# Altium footprint library laihi.PcbLib: 222 footprints (part 5 of 14)
Each footprint in its own frame and in the unit in brackets; x right, y up, seen from the top. Pads: shape width x height; smd on the part's side, far side on the other; paste and mask are expansions set on the pad; w line width, h text height; cw(c..) or ccw(c..) is an arc to the next point about the centre after c.
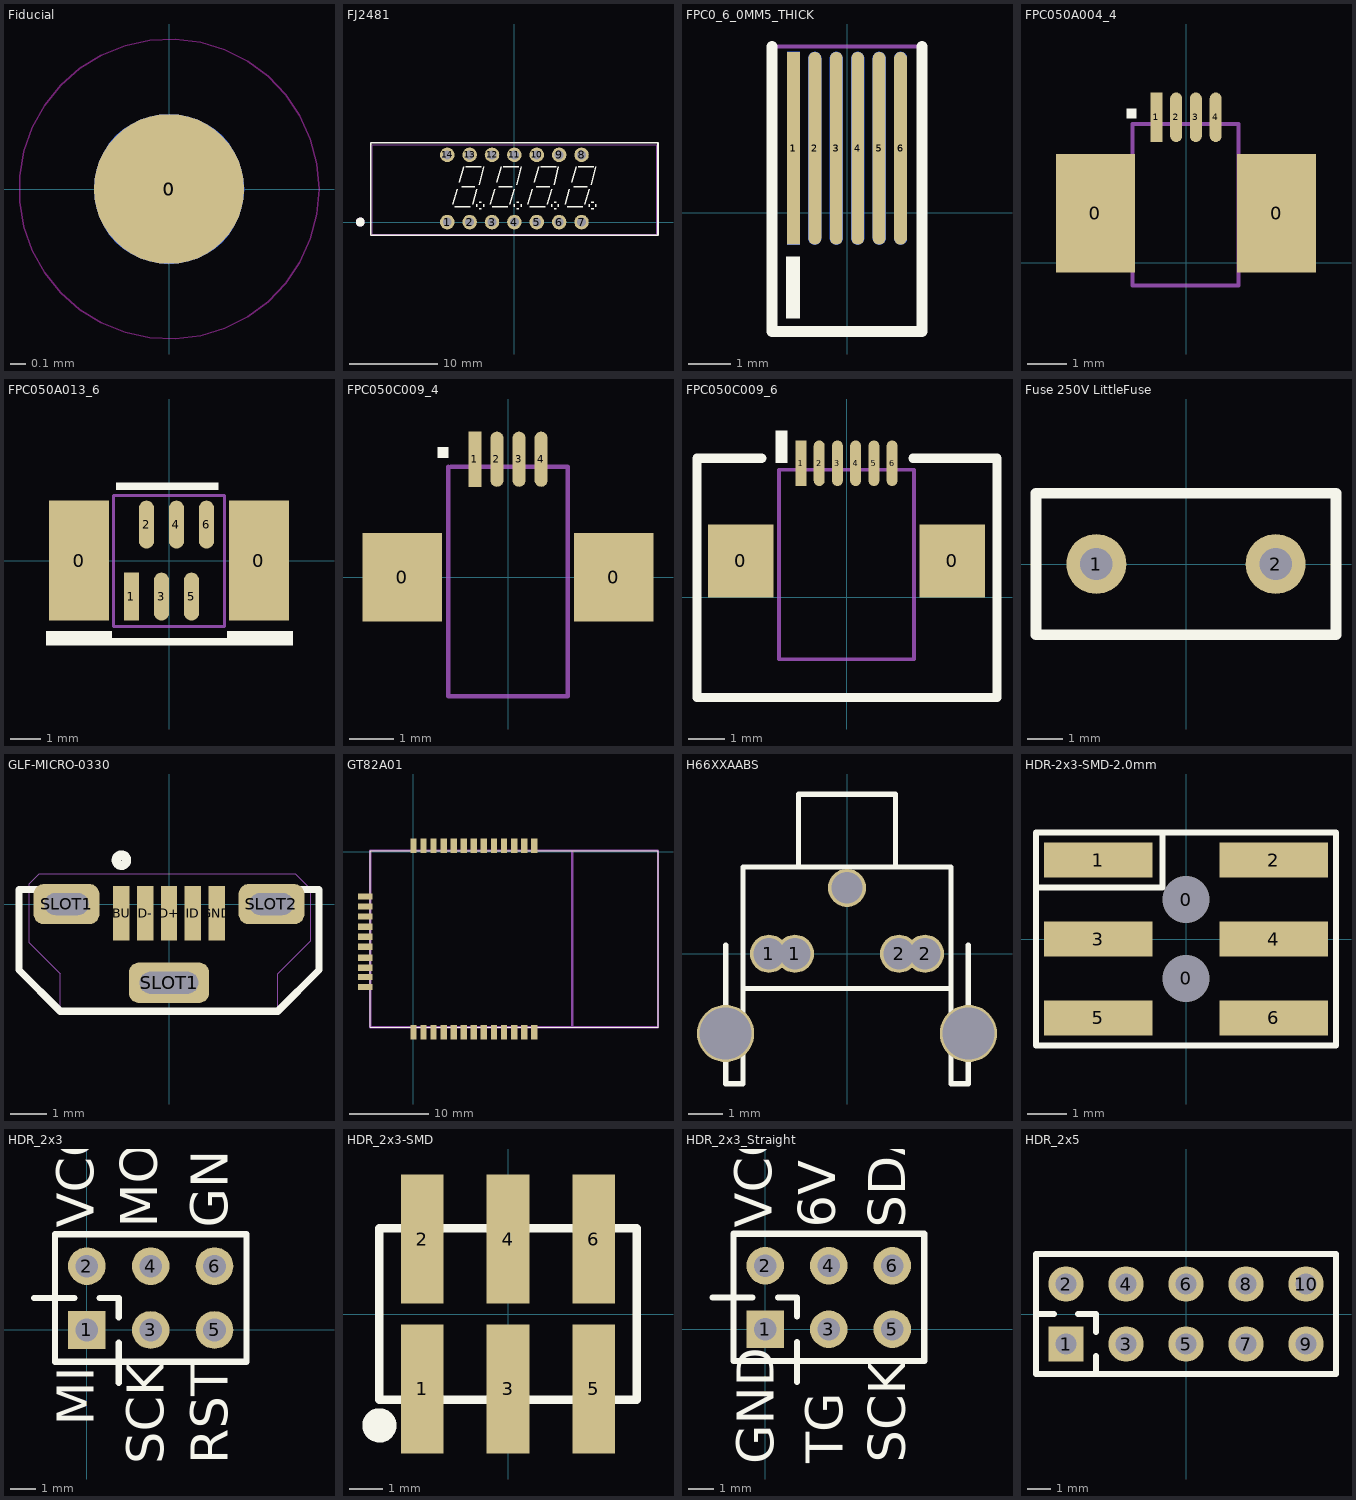
[diagram p4: the footprints below, top view; thin cyan lines are the x and y axes]

## Fiducial [mm]
pads (2):
  round 1 smd paste-10 mask+0.5: 0(0,0)
  round 1 smd far side paste-10 mask+0.5: 0(0,0)
Keep-Out Layer:
  circle w0.01: c0,0 r1

## FJ2481 [mil] "2.54 mm pitch 2*7 LED 4 digits"
height 236.22
pads (14):
  round 65 / inner round 65 / far side rect 65x65 hole 39.37: 1(-300,0)
  round 65 hole 39.37: 2(-200,0) 3(-100,0) 4(0,0) 5(100,0) 6(200,0) 7(300,0) 8(300,300) 9(200,300) 10(100,300) 11(0,300) 12(-100,300) 13(-200,300) 14(-300,300)
Top Overlay:
  circle w20: c-688.9,0 r10
  lines w5.91: -275.59,78.74 -255.91,147.64 ; -265.75,68.9 -196.85,68.9 ; -246.06,177.17 -226.38,246.06 ; -236.22,157.48 -177.17,157.48 ; -216.54,246.06 -147.64,246.06 ; -187.01,78.74 -167.32,147.64 ; -167.32,68.9 -167.32,78.74 ; -157.48,59.06 -147.64,59.06 ; -157.48,88.58 -147.64,88.58 ; -157.48,167.32 -137.8,246.06 ; -137.8,68.9 -137.8,78.74 ; -108.27,78.74 -88.58,147.64 ; -98.43,68.9 -29.53,68.9 ; -78.74,177.17 -59.06,246.06 ; -68.9,157.48 -9.84,157.48 ; -49.21,246.06 19.69,246.06 ; -19.68,78.74 0,147.64 ; 0,68.9 0,78.74 ; 9.84,59.06 19.69,59.06 ; 9.84,88.58 19.69,88.58 ; 9.84,167.32 29.53,246.06 ; 29.53,68.9 29.53,78.74 ; 59.06,78.74 78.74,147.64 ; 68.9,68.9 137.8,68.9 ; 88.58,177.17 108.27,246.06 ; 98.43,157.48 157.48,157.48 ; 118.11,246.06 187.01,246.06 ; 147.64,78.74 167.32,147.64 ; 167.32,68.9 167.32,78.74 ; 177.17,59.06 187.01,59.06 ; 177.17,88.58 187.01,88.58 ; 177.17,167.32 196.85,246.06 ; 196.85,68.9 196.85,78.74 ; 226.38,78.74 246.06,147.64 ; 236.22,68.9 305.12,68.9 ; 255.91,177.17 275.59,246.06 ; 265.75,157.48 324.8,157.48 ; 285.43,246.06 354.33,246.06 ; 314.96,78.74 334.65,147.64 ; 334.65,68.9 334.65,78.74 ; 344.49,59.06 354.33,59.06 ; 344.49,88.58 354.33,88.58 ; 344.49,167.32 364.17,246.06 ; 364.17,68.9 364.17,78.74
  lines w8: -641.73,-59.06 641.73,-59.06 641.73,354.33 -641.73,354.33 -641.73,-59.06
Mechanical 13:
  circle w20: c-688.9,0 r10
  circle w1: c-300,0 r19.68
  circle w1: c-200,0 r19.75
  lines w1: -635.83,-55.12 635.83,-55.12 635.83,346.46 -635.83,346.46 -635.83,-55.12 ; -310,-10 -290,-10 -290,10 -310,10 -310,-10 ; -210,-10 -210,10 -190,10 -190,-10 -210,-10
Mechanical 15:
  lines w1: -635.83,-55.12 -635.83,346.46 635.83,346.46 635.83,-55.12 -635.83,-55.12

## FPC0_6_0MM5_THICK [mm] "0.5mm pitch FPC 连接头部分"
height 0.3
pads (12):
  rect 0.3x4.5 smd: 1(-1.25,1.5)
  rect 0.3x4.5 smd far side: 1(-1.25,1.5)
  oval 0.3x4.5 smd: 2(-0.75,1.5) 3(-0.25,1.5) 4(0.25,1.5) 5(0.75,1.5) 6(1.25,1.5)
  oval 0.3x4.5 smd far side: 2(-0.75,1.5) 3(-0.25,1.5) 4(0.25,1.5) 5(0.75,1.5) 6(1.25,1.5)
Top Overlay:
  rectangle: -1.425,-2.475 -1.1,-1.025
  lines w0.254: -1.75,3.875 -1.75,-2.775 1.75,-2.775 1.75,3.875
Mechanical 13:
  lines w0.1: -1.75,-2.775 1.75,-2.775 1.75,3.875 -1.75,3.875 -1.75,-2.775
3D body: height 0.3, standoff 0, extent -1.75,-2.775 1.75,-0.1

## FPC050A004_4 [mm] "0.5mm slidelock 0.4A 50V Bottom contact FPC connector"
height 2
pads (6):
  rect 2x3 smd: 0(-2.29,1.25) 0(2.29,1.25)
  rect 0.3x1.25 smd: 1(-0.75,3.675)
  oval 0.3x1.25 smd: 2(-0.25,3.675) 3(0.25,3.675) 4(0.75,3.675)
Top Overlay:
  rectangle: -1.5,3.65 -1.25,3.9
Mechanical 13:
  lines w0.1: -1.35,3.5 -1.35,-0.575 1.325,-0.575 1.325,3.5 ; -1.3,3.5 1.3,3.5

## FPC050A013_6 [mm] "0.5mm slidelock vertical 0.4A 50V Bottom contact FPC connector"
height 2
pads (8):
  rect 2x4 smd: 0(-3,0) 0(3,0)
  rect 0.5x1.6 smd: 1(-1.25,-1.2)
  oval 0.5x1.6 smd: 2(-0.75,1.2) 3(-0.25,-1.2) 4(0.25,1.2) 5(0.75,-1.2) 6(1.25,1.2)
Top Overlay:
  rectangle: -4.1,-2.825 4.125,-2.575
  rectangle: 1.925,-2.6 4.125,-2.35
  rectangle: -4.1,-2.6 -1.9,-2.35
  rectangle: -1.775,2.35 1.65,2.6
Mechanical 13:
  lines w0.1: -1.85,-2.2 -1.85,2.175 1.85,2.175 1.85,-2.2 -1.85,-2.2
3D body: height 4.5, standoff 0, extent -4.35,-1.325 4.35,1.325

## FPC050C009_4 [mm] "0.3mm thickness 0.5mm pitch fliplock 0.4A 50V Bottom contact FPC connector"
height 2
pads (6):
  rect 1.8x2 smd: 0(-2.4,0) 0(2.4,0)
  rect 0.3x1.25 smd: 1(-0.75,2.675)
  oval 0.3x1.25 smd: 2(-0.25,2.675) 3(0.25,2.675) 4(0.75,2.675)
Top Overlay:
  rectangle: -1.6,2.7 -1.35,2.95
Mechanical 13:
  lines w0.1: -1.35,2.5 -1.35,-2.7 1.35,-2.7 1.35,2.5 -1.3,2.5

## FPC050C009_6 [mm] "0.3mm thickness 0.5mm pitch fliplock 0.4A 50V Bottom contact FPC connector"
height 2
pads (8):
  rect 1.8x2 smd: 0(-2.9,1) 0(2.9,1)
  rect 0.3x1.25 smd: 1(-1.25,3.675)
  oval 0.3x1.25 smd: 2(-0.75,3.675) 3(-0.25,3.675) 4(0.25,3.675) 5(0.75,3.675) 6(1.25,3.675)
Top Overlay:
  rectangle: -1.95,3.675 -1.625,4.575
  lines w0.254: -2.325,3.81 -4.1,3.81 -4.1,-2.75 4.125,-2.75 4.125,2.8 4.125,3.81 1.825,3.81
Mechanical 13:
  lines w0.1: -1.85,3.5 -1.85,-1.7 1.85,-1.7 1.85,3.5 -1.8,3.5
3D body: height 3.7, standoff 0, extent -3.85,-2.525 3.85,3.575

## Fuse 250V LittleFuse [mm] "Fuse 8.5mm x 4mm 250V"
height 8
pads (2):
  round 1.7 hole 0.92: 1(-2.54,0) 2(2.54,0)
Top Overlay:
  lines w0.3: -4.25,-2 4.25,-2 4.25,2 -4.25,2 -4.25,-2

## GLF-MICRO-0330 [mm] "Micro USB 5P/F Type-B SMT vertical"
height 5.6
pads (8):
  rect 0.45x1.5 smd: D+(0,-0.25) D-(-0.65,-0.25) GND(1.3,-0.25) ID(0.65,-0.25) VBUS(-1.3,-0.25)
  rrect50% 1.8x1.1 hole 0.6 slot 1.2 at 0 deg: SLOT1(-2.8,0) SLOT2(2.8,0)
  rrect50% 2.2x1.1 hole 0.6 slot 1.6 at 0 deg: SLOT1(0,-2.15)
Top Overlay:
  circle w0.25: c-1.3,1.2 r0.141
  lines w0.2: -3.4,0.4 -4.1,0.4 -4.1,-1.1 -4.1,-1.8 -2.975,-2.925 2.975,-2.925 4.1,-1.8 4.1,-1.1 4.1,0.4 3.4,0.4
Mechanical 15:
  lines w0.025: 3.825,-1.05 2.975,-1.9 ; 2.975,-1.9 2.975,-2.925 -2.975,-2.925 -2.975,-2.675 -2.975,-1.9 -3.825,-1.05 -3.825,0.55 -3.55,0.825 3.45,0.825 3.875,0.4 3.875,-1 2.975,-1.9
3D body "1051330011.stp": height 7.43, standoff -2.37, extent -4.067,-3.311 3.958,1.139

## GT82A01 [mm] "GT82A01 Bluetooth 4.0  Low Energy Module"
pads (36):
  rect 0.8x1.8 smd: 0(15.24,0.762) 1(13.97,0.762) 2(12.7,0.762) 3(11.43,0.762) 4(10.16,0.762) 5(8.89,0.762) 6(7.62,0.762) 7(6.35,0.762) 8(5.08,0.762) 9(3.81,0.762) 10(2.54,0.762) 11(1.27,0.762) 12(0,0.762) 23(0,-22.784) 24(1.27,-22.784) 25(2.54,-22.784) 26(3.81,-22.784) 27(5.08,-22.784) 28(6.35,-22.784) 29(7.62,-22.784) 30(8.89,-22.784) 31(10.16,-22.784) 32(11.43,-22.784) 33(12.7,-22.784) 34(13.97,-22.784) 35(15.24,-22.784)
  rect 1.8x0.8 smd: 13(-6.096,-5.639) 14(-6.096,-6.909) 15(-6.096,-8.179) 16(-6.096,-9.449) 17(-6.096,-10.719) 18(-6.096,-11.989) 19(-6.096,-13.386) 20(-6.096,-14.656) 21(-6.096,-15.799) 22(-6.096,-17.069)
Top Overlay:
  lines w0.15: -5.461,-22.149 -5.461,0.152 30.861,0.152 30.861,-22.149 -5.461,-22.149
Mechanical 1:
  lines w0.305: 20.066,-22.149 20.066,0.152 ; -5.461,-22.149 30.861,-22.149 30.861,0.152 -5.461,0.152 -5.461,-22.149

## H66XXAABS [mm] "90 degree press switch"
height 6
pads (7):
  round 1.1 hole 0.9: 1(-2.25,0) 1(-1.5,0) 2(1.5,0) 2(2.25,0) ""(0,1.9)
  round 1.65 hole 1.5: ""(-3.5,-2.3) ""(3.5,-2.3)
Top Overlay:
  lines w0.152: -3.5,0.25 -3.5,-3.75 -3,-3.75 -3,0.25 ; -1.4,2.6 -1.4,4.6 1.4,4.6 1.4,2.6 ; 3,0.25 3,-3.75 3.5,-3.75 3.5,0.25 ; -3,-1 3,-1 3,2.5 -3,2.5 -3,-1
3D body: height 6, standoff 0, extent -3,-1 3,2.5

## HDR-2x3-SMD-2.0mm [mm]
pads (8):
  round 1 hole 1.2: 0(0,-1) 0(0,1)
  rect 2.75x0.89 smd: 1(-2.225,2) 2(2.225,2) 3(-2.225,0) 4(2.225,0) 5(-2.225,-2) 6(2.225,-2)
Top Overlay:
  lines w0.152: -0.6,2.7 -0.6,1.3 -3.8,1.3 ; -3.8,1.3 -3.8,-2.7 3.8,-2.7 3.8,2.7 0,2.7 -3.8,2.7 -3.8,1.3
3D body "pin_header_a-sl200-dg-g06mp1.stp": height 6.5, standoff 0, extent -3.25,-2.975 3.25,2.975

## HDR_2x3 [mm] "2x3 header 2.54mm"
pads (6):
  rect 1.5x1.5 hole 0.9: 1(0,0)
  round 1.5 hole 0.9: 2(0,2.54) 3(2.54,0) 4(2.54,2.54) 5(5.08,0) 6(5.08,2.54)
Top Overlay:
  lines w0.254: -2.1,1.27 -0.508,1.27 ; 0.508,1.27 1.27,1.27 1.27,0.508 ; 1.27,-2.1 1.27,-0.508 ; -1.27,-1.27 -1.27,3.81 6.35,3.81 6.35,-1.27 -1.27,-1.27
  text "GND" at 6.096,4.064 h2.54
  text "RST" at 6.096,-5.334 h2.54
  text "MO" at 3.302,4.064 h2.54
  text "SCK" at 3.556,-5.334 h2.54
  text "MI" at 0.762,-3.81 h2.54
  text "VCC" at 0.762,4.064 h2.54

## HDR_2x3-SMD [mil] "Board-Board Conn, Header, 6-way, 2-row"
height 393.7
pads (6):
  rect 50x150 smd: 1(-100,-87.5) 2(-100,87.5) 3(0,-87.5) 4(0,87.5) 5(100,-87.5) 6(100,87.5)
Top Overlay:
  circle w20: c-150,-130 r10
  lines w10: -150,-100 150,-100 150,100 -150,100 -150,-100
3D body "pin_header_a-sl254-dg-g06mp1.stp": height 382.03, standoff -1.57, extent -149.99,-147.63 150.01,147.64

## HDR_2x3_Straight [mm] "2x3 header 2.54mm"
pads (6):
  rect 1.5x1.5 hole 0.9: 1(0,0)
  round 1.5 hole 0.9: 2(0,2.54) 3(2.54,0) 4(2.54,2.54) 5(5.08,0) 6(5.08,2.54)
Top Overlay:
  lines w0.254: -2.1,1.27 -0.508,1.27 ; 0.508,1.27 1.27,1.27 1.27,0.508 ; 1.27,-2.1 1.27,-0.508 ; -1.27,-1.27 -1.27,3.81 6.35,3.81 6.35,-1.27 -1.27,-1.27
  text "SDA" at 6.096,4.064 h2.54
  text "SCK" at 6.096,-5.334 h2.54
  text "6V" at 3.302,4.064 h2.54
  text "TG" at 3.607,-5.359 h2.54
  text "GND" at 0.838,-5.385 h2.54
  text "VCC" at 0.762,4.064 h2.54

## HDR_2x5 [mm]
pads (10):
  rect 1.5x1.5 hole 0.9: 1(-5.08,-1.27)
  round 1.5 hole 0.9: 2(-5.08,1.27) 3(-2.54,-1.27) 4(-2.54,1.27) 5(0,-1.27) 6(0,1.27) 7(2.54,-1.27) 8(2.54,1.27) 9(5.08,-1.27) 10(5.08,1.27)
Top Overlay:
  lines w0.254: -6.35,0 -5.588,0 ; -4.572,0 -3.81,0 -3.81,-0.762 ; -3.81,-2.54 -3.81,-1.778 ; -6.35,-2.54 -6.35,2.54 6.35,2.54 6.35,-2.54 -6.35,-2.54